# Altium footprint library master.PcbLib: 98 footprints (part 3 of 7)
Each footprint in its own frame and in the unit in brackets; x right, y up, seen from the top. Pads: shape width x height; smd on the part's side, far side on the other; paste and mask are expansions set on the pad; w line width, h text height; cw(c..) or ccw(c..) is an arc to the next point about the centre after c.
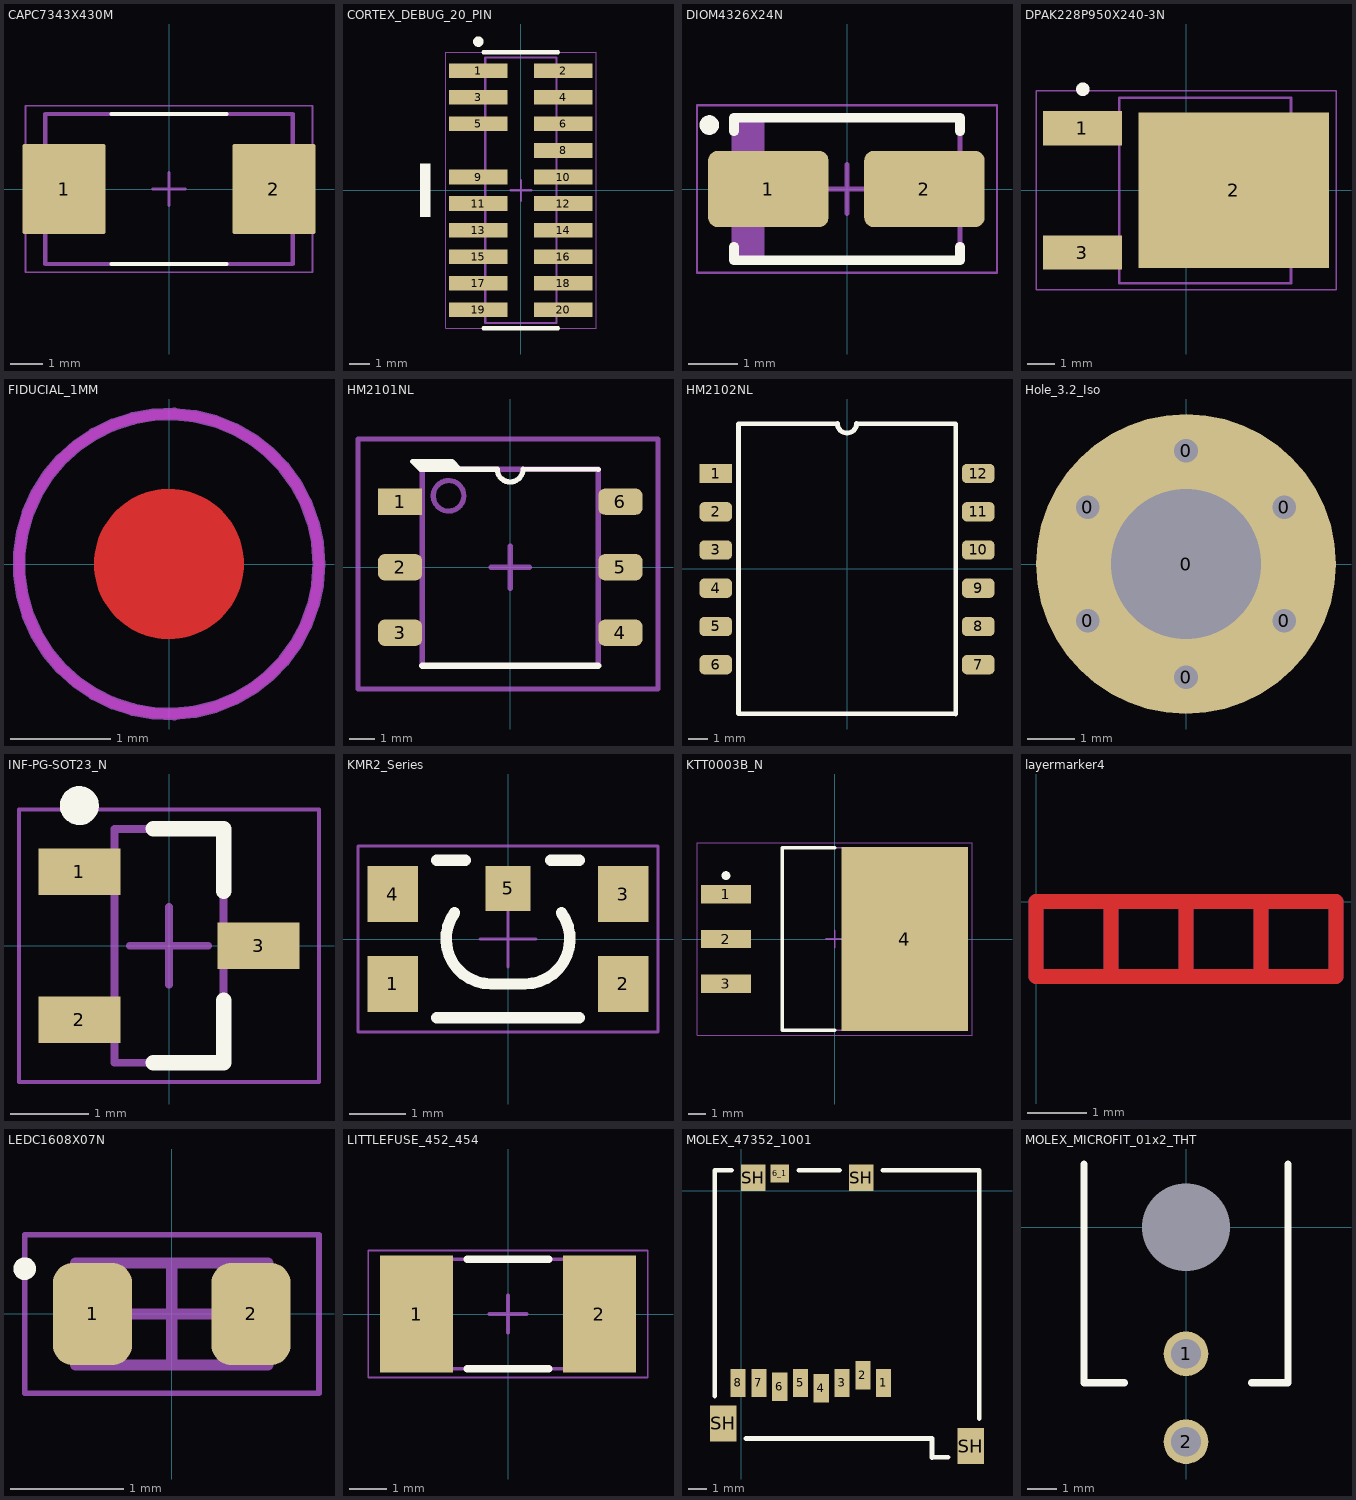
[diagram p2: the footprints below, top view; thin cyan lines are the x and y axes]

## CAPC7343X430M [mm] "KEMET KO-CAP® T521 2917 (7343 Metric) Max"
height 4.3
pads (2):
  rrect5% 2.55x2.77 smd: 1(-3.22,0) 2(3.22,0)
Top Overlay:
  lines w0.127: -1.77,-2.3 1.77,-2.3 ; -1.77,2.3 1.77,2.3
Mechanical 13:
  lines w0.127: -3.8,-2.3 -3.8,2.3 ; -3.8,-2.3 3.8,-2.3 ; -3.8,-2.3 -3.8,2.3 ; -3.8,-2.3 3.8,-2.3 ; -3.8,2.3 3.8,2.3 ; -3.8,2.3 3.8,2.3 ; 3.8,-2.3 3.8,2.3 ; 3.8,-2.3 3.8,2.3
Mechanical 15:
  lines w0.05: -4.405,-2.555 4.405,-2.555 4.405,2.555 -4.405,2.555 -4.405,-2.555
  lines w0.1: -0.5,0 0.5,0 ; 0,-0.5 0,0.5
3D body "T521X336M050ATE075.step": height 4.31, standoff 0.01, extent -3.8,-2.3 3.8,2.3

## CORTEX_DEBUG_20_PIN [mm] "ARM Cortex Debug Connector 20 Pin"
height 2.51
pads (19):
  rect 2.8x0.7 smd: 1(-2.035,5.715) 2(2.035,5.715) 3(-2.035,4.445) 4(2.035,4.445) 5(-2.035,3.175) 6(2.035,3.175) 8(2.035,1.905) 9(-2.035,0.635) 10(2.035,0.635) 11(-2.035,-0.635) 12(2.035,-0.635) 13(-2.035,-1.905) 14(2.035,-1.905) 15(-2.035,-3.175) 16(2.035,-3.175) 17(-2.035,-4.445) 18(2.035,-4.445) 19(-2.035,-5.715) 20(2.035,-5.715)
Top Overlay:
  circle w0.25: c-2.032,7.112 r0.125
  rectangle: -4.826,-1.27 -4.318,1.27
  lines w0.2: -1.778,-6.604 1.778,-6.604 ; -1.778,6.604 1.778,6.604
Mechanical 13:
  lines w0.1: -1.7,-6.35 1.7,-6.35 1.7,6.35 -1.7,6.35 -1.7,-6.35
Mechanical 15:
  lines w0.05: -3.6,-6.6 3.6,-6.6 3.6,6.6 -3.6,6.6 -3.6,-6.6
  lines w0.1: -0.5,0 0.5,0 ; 0,-0.5 0,0.5
3D body "FTSH-110-01-L-DV-007-K-P.stp": height 6.98, standoff -0.01, extent -2.921,-6.35 2.921,6.35

## DIOM4326X24N [mm] "Molded Diode, 2-Leads, Body 4,30x2,60mm, IPC Medium Density, SMA, DO-214AC"
height 2.4
pads (2):
  rrect25% 2.45x1.55 smd: 1(-1.6,0) 2(1.575,0)
Top Overlay:
  circle w0.2: c-2.8,1.3 r0.1
  lines w0.2: -2.3,-1.175 -2.3,-1.45 2.3,-1.45 2.3,-1.175 ; -2.3,1.175 -2.3,1.45 2.3,1.45 2.3,1.175
Mechanical 13:
  rectangle: -2.3,-1.45 -1.681,1.45
  lines w0.1: -2.3,-1.45 -2.3,1.45 2.3,1.45 2.3,-1.45 -2.3,-1.45
Mechanical 15:
  lines w0.05: -3.05,-1.7 -3.05,1.7 3.05,1.7 3.05,-1.7 -3.05,-1.7
  lines w0.1: -0.5,0 0.5,0 ; 0,-0.5 0,0.5
3D body "DIOM4326X24N.step": height 2.4, standoff 0, extent -2.52,-1.45 2.52,1.45

## DPAK228P950X240-3N [mm] "D-PAK, 3-Pads, Body 6,25x6,76mm (max), IPC Medium Density"
height 2.4
pads (3):
  rect 2.9x1.25 smd: 1(-3.8,2.28) 3(-3.8,-2.28)
  rect 7x5.7 smd: 2(1.75,0)
Top Overlay:
  circle w0.25: c-3.785,3.708 r0.125
Mechanical 13:
  lines w0.1: -2.45,-3.4 -2.45,3.4 3.85,3.4 3.85,-3.4 -2.45,-3.4
Mechanical 15:
  lines w0.05: -5.5,-3.65 -5.5,3.65 5.5,3.65 5.5,-3.65 -5.5,-3.65
  lines w0.1: -0.5,0 0.5,0 ; 0,-0.5 0,0.5
3D body "DPAK228P950X240-3N.step": height 2.4, standoff 0, extent -4.25,-3.4 5.25,3.4

## FIDUCIAL_1MM [mm] "FIDUCIAL_1MM"
Top Layer:
  circle w1: c0,0 r0.25
Top Layer keep-out:
  circle w0.1: c0,0 r1.5
Top Solder:
  circle w2.6: c0,0 r0.25
Mechanical 22:
  circle w0.127: c0,0 r1.5

## HM2101NL [mil] "XFMR CMC MODULE AECQ BATT MNGT"
height 225.2
pads (6):
  rect 67.5x40 smd: 1(-168.11,100)
  rrect50% 67.5x40 smd: 2(-168.11,0) 3(-168.11,-100) 4(168.11,-100) 5(168.11,0) 6(168.11,100)
Top Overlay:
  region: -77.83,149.46 -136.89,149.46 -148.7,161.27 -89.64,161.27
  lines w7.87: -77.15,149.46 -88.96,161.27 -89.64,161.27 -148.7,161.27 -136.89,149.46 -134.36,149.46 -19.95,149.46 ccw(c-0.2,149.81) 19.55,149.46 ; 19.55,149.81 134.36,149.29
  lines w10: -134.36,-150 134.36,-150
Mechanical 13:
  circle w7.87: c-94.12,108.9 r23.33
  lines w7.87: -134.36,-150 134.36,-150 134.36,149.46 -134.36,149.46 -134.36,-150
Mechanical 15:
  lines w7.87: -29.53,0 0,0 ; 0,-32.49 0,0 ; 0,32.48 0,0 ; 29.53,0 0,0 ; -232.28,-186.02 225.39,-186.02 225.39,195.87 -232.28,195.87 -232.28,-186.02
3D body "HM2101NL_3D.STEP": height 227.17, standoff 1.97, extent -175,-150 175,150

## HM2102NL [mil]
height 197
pads (12):
  rect 67.5x40 smd: 1(-271.65,196.85)
  rrect50% 67.5x40 smd: 2(-271.65,117.85) 3(-271.65,38.85) 4(-271.65,-40.15) 5(-271.65,-119.15) 6(-271.65,-198.15) 7(270.85,-198.15) 8(270.85,-119.15) 9(270.85,-40.15) 10(270.85,38.85) 11(270.85,117.85) 12(270.85,196.85)
Top Overlay:
  lines w10: 224.41,-300.04 -224.41,-299.21 -224.41,299.21 -20.15,300.13 ccw(c-0.4,300.13) 19.35,300.13 224.41,299.21 224.41,-299.21
3D body: height 196.85, standoff 9.84, extent -224.41,-299.21 224.41,299.21

## Hole_3.2_Iso [mm]
height 1.76
pads (7):
  round 0.8 / inner round 0.7 / far side round 0.8 hole 0.5: 0(-2.078,-1.2) 0(-2.078,1.2) 0(0,-2.4) 0(0,2.4) 0(2.078,-1.2) 0(2.078,1.2)
  round 6.35 / inner round 3.4 / far side round 6.35 hole 3.18: 0(0,0)

## INF-PG-SOT23_N [mm] "SOT23, 3-Leads, Body 2.9x1.3mm, Pitch 0.95mm, IPC Medium Density"
height 1.1
pads (3):
  rect 1.05x0.6 smd: 1(-1.15,0.95) 2(-1.15,-0.95) 3(1.15,0)
Top Overlay:
  circle w0.25: c-1.15,1.8 r0.125
  lines w0.2: -0.2,-1.5 0.7,-1.5 0.7,-0.7 ; -0.2,1.5 0.7,1.5 0.7,0.7
Mechanical 13:
  lines w0.1: -0.7,-1.5 0.7,-1.5 0.7,1.5 -0.7,1.5 -0.7,-1.5
Mechanical 15:
  lines w0.05: -1.925,-1.75 -1.925,1.75 1.925,1.75 1.925,-1.75 -1.925,-1.75
  lines w0.1: -0.5,0 0.5,0 ; 0,-0.5 0,0.5
3D body: height 1.1, standoff 0.1, extent -0.7,-1.5 0.7,1.5

## KMR2_Series [mil] "Microminiature Tact Switch for SMT"
height 74.8
pads (5):
  rect 35.43x39.37 smd: 1(-80.71,-31.5) 2(80.71,-31.5) 3(80.71,31.5) 4(-80.71,31.5)
  rect 31.5x31.5 smd: 5(0,35.43)
Top Overlay:
  lines w7.99: -50,-55 50,-55 ; -50,55 -30,55 ; -37.44,18.31 ccw(c-11.81,0) -11.81,-31.5 11.81,-31.5 ccw(c11.81,0) 37.44,18.31 ; 30,55 50,55
Mechanical 15:
  lines w2.01: -19.69,0 19.68,0 ; 0,-19.68 0,19.69 ; -105,-65 -105,65 105,65 105,-65 -105,-65
3D body "KMR211GLFS.stp": height 75.59, standoff -0.77, extent -90.55,-55.12 90.55,55.12

## KTT0003B_N [mm] "D2-PAK, 3-Leads, Body 10.41x8.89mm, Pitch 2.54mm, IPC Medium Density"
height 4.64
pads (4):
  rect 2.85x1.05 smd: 1(-6.2,2.54) 2(-6.2,0) 3(-6.2,-2.54)
  rect 7.2x10.5 smd: 4(4,0)
Top Overlay:
  circle w0.25: c-6.2,3.615 r0.125
  lines w0.2: 0,-5.2 -3,-5.2 -3,5.2 0,5.2
Mechanical 1:
  text ".Designator" at -1.651,-0.508 h1.2
Mechanical 13:
  lines w0.1: -3,-5.2 -3,5.2 5.89,5.2 5.89,-5.2 -3,-5.2
Mechanical 15:
  lines w0.05: -7.85,-5.5 7.85,-5.5 7.85,5.5 -7.85,5.5 -7.85,-5.5
  lines w0.1: -0.5,0 0.5,0 ; 0,-0.5 0,0.5
3D body "KTT0003B_N.step": height 4.64, standoff 0, extent -6.775,-5.2 7.575,5.2

## layermarker4 [mm] "Marker for a 4 layerstack"
Top Layer:
  lines w0.254: 1.27,-1.27 1.27,0 ; 1.27,-1.27 0,-1.27 0,0 1.27,0 ; 1.27,-1.27 2.54,-1.27 ; 1.27,0 2.54,0 ; 2.54,-1.27 2.54,0 ; 2.54,-1.27 3.81,-1.27 ; 2.54,0 3.81,0 ; 3.81,-1.27 3.81,0 ; 3.81,-1.27 5.08,-1.27 5.08,0 3.81,0
  text "1" at 0.559,-0.864 h0.51
Mid-Layer 1:
  lines w0.254: 1.27,-1.27 2.54,-1.27 ; 1.27,-1.27 0,-1.27 0,0 1.27,0 ; 1.27,-1.27 1.27,0 ; 1.27,0 2.54,0 ; 2.54,-1.27 2.54,0 ; 2.54,-1.27 3.81,-1.27 ; 2.54,0 3.81,0 ; 3.81,-1.27 5.08,-1.27 5.08,0 3.81,0 ; 3.81,-1.27 3.81,0
  text "2" at 1.727,-0.864 h0.51
Mid-Layer 2:
  lines w0.254: 1.27,-1.27 0,-1.27 0,0 1.27,0 ; 1.27,-1.27 2.54,-1.27 ; 1.27,-1.27 1.27,0 ; 1.27,0 2.54,0 ; 2.54,-1.27 2.54,0 ; 2.54,-1.27 3.81,-1.27 ; 2.54,0 3.81,0 ; 3.81,-1.27 5.08,-1.27 5.08,0 3.81,0 ; 3.81,-1.27 3.81,0
  text "3" at 2.997,-0.864 h0.51
Bottom Layer:
  lines w0.254: 1.27,-1.27 0,-1.27 0,0 1.27,0 ; 1.27,-1.27 2.54,-1.27 ; 1.27,-1.27 1.27,0 ; 1.27,0 2.54,0 ; 2.54,-1.27 2.54,0 ; 2.54,-1.27 3.81,-1.27 ; 2.54,0 3.81,0 ; 3.81,-1.27 5.08,-1.27 5.08,0 3.81,0 ; 3.81,-1.27 3.81,0
  text "4" at 4.597,-0.864 h0.51

## LEDC1608X07N [mm] "LED, 2-Leads, Body 1,60x0,80mm, IPC Medium Density"
height 0.7
pads (2):
  rrect50% 0.7x0.9 smd: 1(-0.7,0) 2(0.7,0)
Top Overlay:
  circle w0.1: c-1.3,0.4 r0.05
Mechanical 13:
  lines w0.1: -0.85,-0.45 0.85,-0.45 0.85,0.45 -0.85,0.45 -0.85,-0.45
Mechanical 15:
  lines w0.05: -1.3,-0.7 1.3,-0.7 1.3,0.7 -1.3,0.7 -1.3,-0.7
  lines w0.1: -0.45,0 0.45,0 ; 0,-0.45 0,0.45
3D body "STEP-WL-SMCW-0603-rev1.stp": height 0.7, standoff 0, extent -0.8,-0.4 0.8,0.4

## LITTLEFUSE_452_454 [mm] "Littlefuse 452/454 Series Fuse, 2-Leads, Body 6,10x2,69mm, IPC Medium Density"
height 2.94
pads (2):
  rect 1.96x3.15 smd: 1(-2.45,0) 2(2.45,0)
Top Overlay:
  lines w0.2: -1.1,-1.475 1.1,-1.475 ; -1.1,1.475 1.1,1.475
Mechanical 13:
  lines w0.1: -3.15,-1.47 -3.15,1.47 3.15,1.47 3.15,-1.47 -3.15,-1.47
Mechanical 15:
  lines w0.05: -3.75,-1.7 3.75,-1.7 3.75,1.7 -3.75,1.7 -3.75,-1.7
  lines w0.1: -0.5,0 0.5,0 ; 0,-0.5 0,0.5
3D body "LITTLEFUSE_452_454.step": height 2.94, standoff 0, extent -3.15,-1.47 3.15,1.47

## MOLEX_47352_1001 [mm] "Molex SD Card Reader Push Push Type VDD Detect Switch"
height 1.88
pads (13):
  rect 0.8x1.5 smd: 1(7.54,-10.16) 2(6.44,-9.76) 3(5.34,-10.16) 4(4.24,-10.435) 5(3.14,-10.16) 6(2.04,-10.36) 7(0.94,-10.16) 8(-0.16,-10.16)
  rect 1x0.95 smd: 6_1(2.04,0.925)
  rect 1.4x1.9 smd: SH(-0.95,-12.3) SH(12.15,-13.5)
  rect 1.3x1.4 smd: SH(0.65,0.7) SH(6.35,0.7)
Top Overlay:
  lines w0.254: -1.397,-10.846 -1.397,1.067 ; -1.397,1.092 -0.508,1.092 ; 0.254,-13.1 10.077,-13.1 ; 3.048,1.092 5.207,1.092 ; 7.493,1.092 12.598,1.092 ; 10.1,-14.1 10.1,-13.1 ; 10.109,-14.097 10.947,-14.097 ; 12.598,-12.04 12.598,1.067
3D body "473521001.stp": height 1.9, standoff 0.02, extent -1.4,-14.204 12.7,0.996

## MOLEX_MICROFIT_01x2_THT [mil] "Micro-Fit 3.0 Right Angle Header, 3.00mm Pitch, Dual Row, 2 Circuits, with Snap-in Plastic Peg PCB Lock, Tin, Glow Wire Capable, Black, 43045-0200"
height 345
pads (3):
  round 60 hole 40: 1(0,-170) 2(0,-287.99)
  round 39.37 hole 117.99 unplated paste+0 mask+4: ""(0,0)
Top Overlay:
  lines w10: -137,85 -137,-209.02 -83,-209.02 ; 88,-209.02 137,-209.02 137,85
3D body "430450200.stp": height 345.35, standoff -125.12, extent -140.75,-300.95 140.75,180.94